# Altium footprint library NDLib.PCBLIB: 499 footprints (part 15 of 32)
Each footprint in its own frame and in the unit in brackets; x right, y up, seen from the top. Pads: shape width x height; smd on the part's side, far side on the other; paste and mask are expansions set on the pad; w line width, h text height; cw(c..) or ccw(c..) is an arc to the next point about the centre after c.
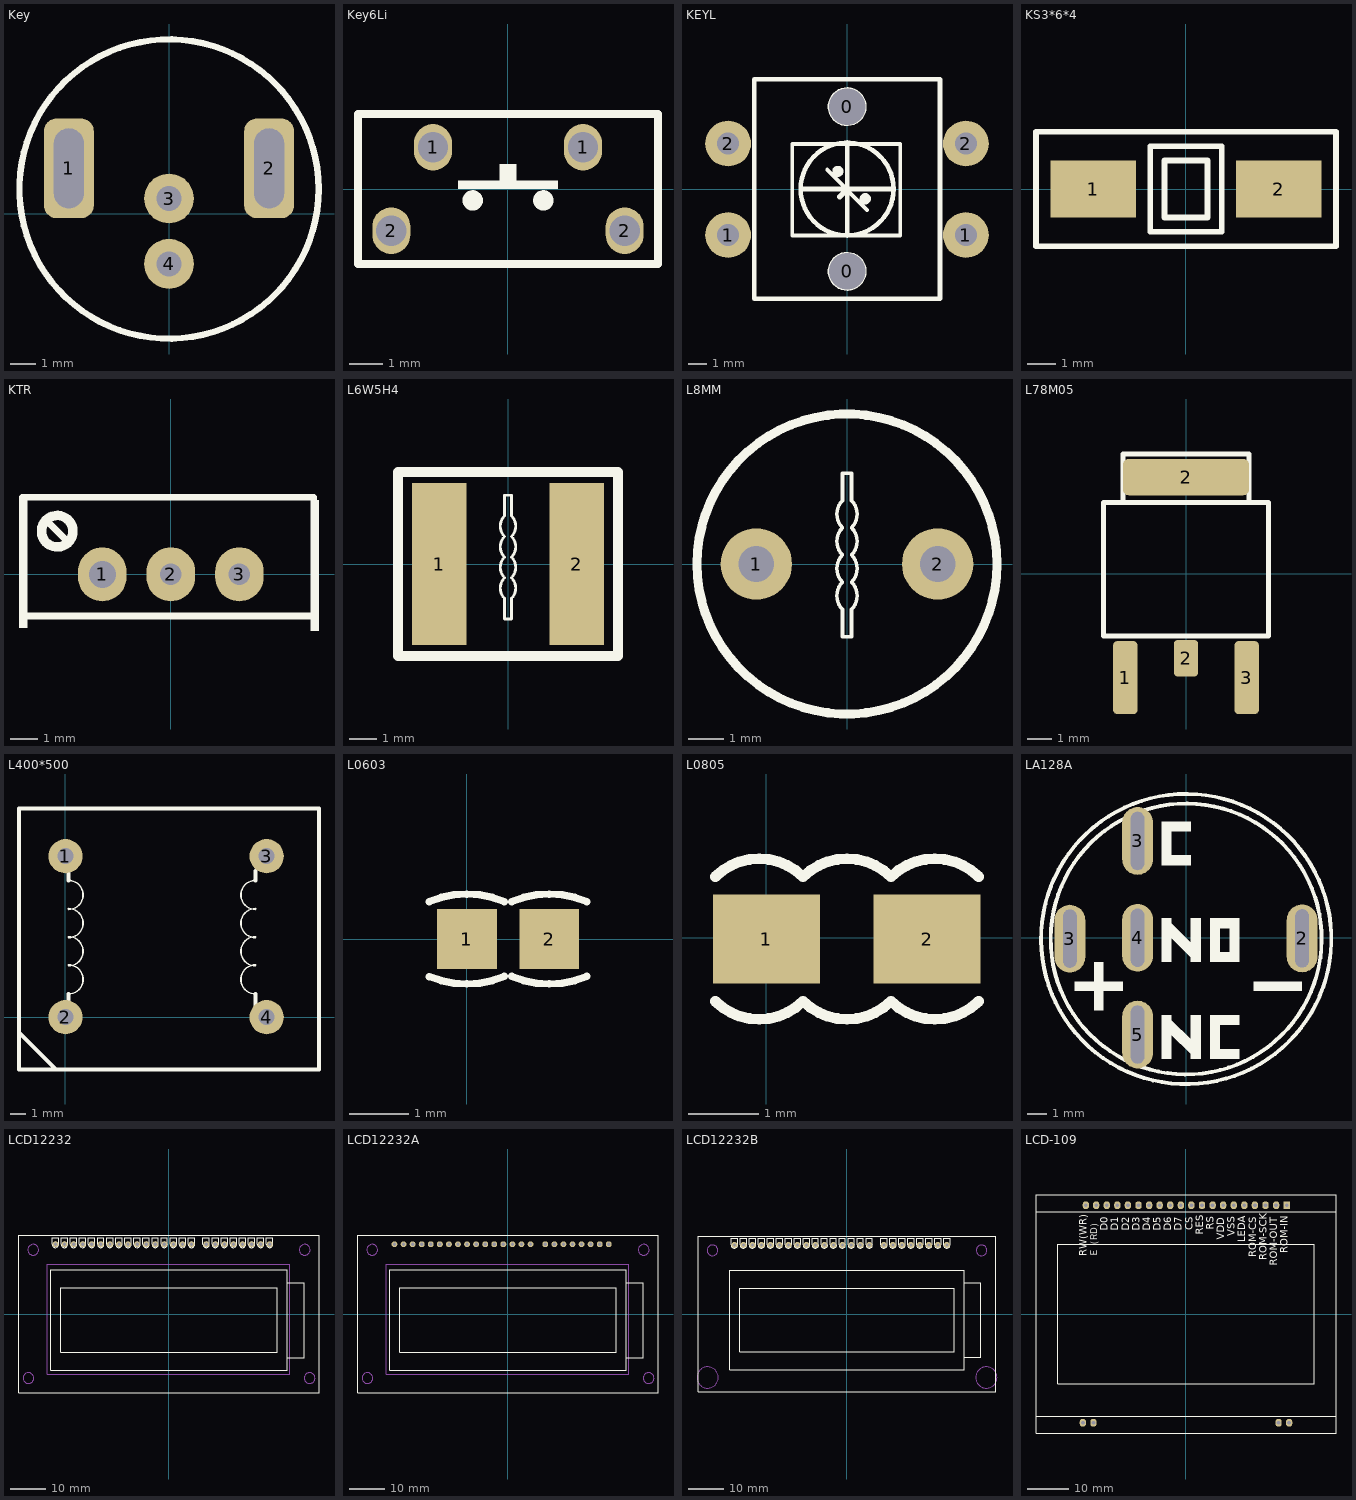
[diagram p14: the footprints below, top view; thin cyan lines are the x and y axes]

## Key [mm]
pads (4):
  rrect50% 2x4 hole 1.2 slot 3.2 at 90 deg: 1(-4.015,1.827) 2(4.015,1.827)
  round 2 hole 1: 3(0,0.619) 4(0,-2)
TopOverlay:
  circle w0.254: c0,1 r6

## Key6Li [mil]
height 295.28
pads (4):
  oval 45x55 hole 36: 1(-88.58,49.21) 1(88.58,49.21) 2(-137.8,-49.21) 2(137.8,-49.21)
TopOverlay:
  circle w12: c-41.72,-13.44 r6
  circle w12: c41.72,-13.44 r6
  rectangle: -59.06,0 59.06,9.84
  region: 9.84,9.84 9.84,29.53 0,29.53 0,9.84
  region: 0,9.84 0,29.53 -9.84,29.53 -9.84,9.84
  lines w10: -177.17,-88.58 -177.17,88.58 177.17,88.58 177.17,-88.58 -177.17,-88.58

## KEYL [mm]
pads (6):
  round 1.651 hole 2 unplated: 0(0,-4.5) 0(0,4.5)
  round 2.5 hole 1.2: 1(-6.506,-2.516) 1(6.494,-2.516) 2(-6.506,2.484) 2(6.494,2.484)
TopOverlay:
  circle w0.127: c0,4.5 r1
  circle w0.127: c0,-4.5 r1
  circle w0.305: c-0.508,0.965 r0.152
  circle w0.305: c0.991,-0.533 r0.152
  circle w0.254: c0,0 r2.54
  lines w0.2: -2.997,-2.54 -2.997,2.464 2.896,2.464 2.896,-2.54 -2.997,-2.54
  lines w0.203: -1.092,1.067 1.092,-1.143
  lines w0.254: -2.54,0 2.54,0 ; 0,-2.54 0,2.54 ; -5.08,-6 -5.08,6 5.08,6 5.08,-6 -5.08,-6
  lines w0.305: -0.406,-0.432 0,-0.025
BottomOverlay:
  circle w0.5: c-6.506,2.484 r1.7
  circle w0.5: c-6.506,-2.516 r1.7
  circle w0.5: c6.494,2.484 r1.7
  circle w0.5: c6.494,-2.516 r1.7

## KS3*6*4 [mm]
pads (2):
  rect 3x2 smd: 1(-3.25,0) 2(3.25,0)
TopOverlay:
  lines w0.2: -5.25,-2 -5.25,2 5.25,2 5.25,-2 -5.25,-2 ; -1.25,-1.5 1.25,-1.5 1.25,1.5 -1.25,1.5 -1.25,-1.5 ; -0.75,-1 0.75,-1 0.75,1 -0.75,1 -0.75,-1

## KTR [mm]
pads (3):
  oval 1.8x2 hole 1: 1(-2.54,0)
  oval 1.8x2 hole 0.8: 2(0,0) 3(2.54,0)
TopOverlay:
  circle w0.354: c-4.211,1.601 r0.583
  rectangle: -5.627,-1.992 -5.307,2.86
  rectangle: 5.173,-2.092 5.493,2.761
  lines w0.254: -5.5,-1.84 -5.5,2.86 5.3,2.86 5.3,-1.939 ; -5.4,-1.54 5.3,-1.54 ; -4.611,2.001 -3.811,1.201

## L6W5H4 [mm]
height 40
pads (2):
  rect 2x6 smd: 1(-2.54,0) 2(2.54,0)
TopOverlay:
  lines w0.1: -0.127,-1.27 cw(c0.254,-0.889) -0.127,-0.508 cw(c0.254,-0.127) -0.127,0.254 cw(c0.254,0.635) -0.127,1.016 cw(c0.254,1.397) -0.127,1.778 ; 0.127,-1.27 ccw(c-0.254,-0.889) 0.127,-0.508 ccw(c-0.254,-0.127) 0.127,0.254 ccw(c-0.254,0.635) 0.127,1.016 ccw(c-0.254,1.397) 0.127,1.778
  lines w0.102: -0.127,-1.27 -0.127,-2.032 0.127,-2.032 0.127,-1.27 ; -0.127,1.778 -0.127,2.54 0.127,2.54 0.127,1.778
  lines w0.381: -4.064,-3.4 4.064,-3.4 4.064,3.4 -4.064,3.4 -4.064,-3.4

## L8MM [mm]
height 10
pads (2):
  round 2 hole 1: 1(-2.54,0) 2(2.54,0)
TopOverlay:
  circle w0.254: c0,0 r4.2
  lines w0.1: -0.127,-1.27 cw(c0.254,-0.889) -0.127,-0.508 cw(c0.254,-0.127) -0.127,0.254 cw(c0.254,0.635) -0.127,1.016 cw(c0.254,1.397) -0.127,1.778 ; 0.127,-1.27 ccw(c-0.254,-0.889) 0.127,-0.508 ccw(c-0.254,-0.127) 0.127,0.254 ccw(c-0.254,0.635) 0.127,1.016 ccw(c-0.254,1.397) 0.127,1.778
  lines w0.102: -0.127,-1.27 -0.127,-2.032 0.127,-2.032 0.127,-1.27 ; -0.127,1.778 -0.127,2.54 0.127,2.54 0.127,1.778
3D body: height 7, standoff 0, extent 2.828,-2.863 4.013,2.812
3D body: height 7, standoff 0, extent -4.013,-4.039 2.838,3.987

## L78M05 [mm]
height 4
pads (4):
  rrect30% 1x3 smd: 1(-2.5,-4.282) 3(2.5,-4.282)
  rrect30% 1x1.5 smd: 2(0,-3.482)
  rrect30% 5.2x1.5 smd: 2(0,3.982)
TopOverlay:
  lines w0.2: -3.4,2.934 -3.4,-2.566 3.4,-2.566 3.4,2.934 ; -3.4,2.934 3.4,2.934 ; -3.4,2.934 -2.6,2.934 -2.6,4.934 2.6,4.934 2.6,2.934 3.4,2.934
3D body: height 0.77, standoff -0.01, extent -0.611,-8.606 0.639,-6.606

## L400*500 [mil]
pads (4):
  round 85 hole 40: 1(0,400) 2(0,0) 3(500,400) 4(500,0)
TopOverlay:
  lines w3.94: 7.44,57.3 ccw(c7.44,93.7) 7.44,130.1 ; 7.44,127.3 ccw(c7.44,163.7) 7.44,200.1 ; 7.44,197.3 ccw(c7.44,233.7) 7.44,270.1 ; 7.44,267.3 ccw(c7.44,303.7) 7.44,340.1 ; 472.44,57.3 cw(c472.44,93.7) 472.44,130.1 ; 472.44,127.3 cw(c472.44,163.7) 472.44,200.1 ; 472.44,197.3 cw(c472.44,233.7) 472.44,270.1 ; 472.44,267.3 cw(c472.44,303.7) 472.44,340.1
  lines w10: -115.37,-24.45 -115.37,-37.78 -23.48,-129.67 ; 7.44,23.7 7.44,57.3 ; 7.44,340.1 7.44,363.7 ; 472.44,28.7 472.44,57.3 ; 472.44,340.1 472.44,363.7 ; -115.37,-129.67 -115.37,518.11 629.97,518.11 629.97,-129.67 -115.37,-129.67

## L0603 [mil]
pads (2):
  rect 40x40 smd: 1(0,0) 2(55,0)
TopOverlay:
  lines w5: -25,-25 ccw(c0,35) 25,-25 ; -25,25 cw(c0,-35) 25,25 ; 30,-25 ccw(c55,35) 80,-25 ; 30,25 cw(c55,-35) 80,25

## L0805 [mil]
pads (2):
  rect 60x50 smd: 1(0.13,-0.61) 2(90.13,-0.61)
TopOverlay:
  lines w6: -28.54,-35.43 ccw(c-3.94,-10.83) 20.67,-35.43 ccw(c45.28,-10.83) 69.88,-35.43 ccw(c94.49,-10.83) 119.09,-35.43 ; -28.54,34.2 cw(c-3.94,9.6) 20.67,34.2 cw(c45.28,9.6) 69.88,34.2 cw(c94.49,9.6) 119.09,34.2

## LA128A [mm]
pads (5):
  oval 1.6x3.5 hole 0.7 slot 3 at 90 deg: 2(6,-0.035) 3(-6,-0.045) 3(-2.5,5) 4(-2.5,0) 5(-2.5,-5)
TopOverlay:
  region: 6,-2.75 6,-2.25 3.5,-2.25 3.5,-2.75
  region: -4.25,-1.25 -4.75,-1.25 -4.75,-3.75 -4.25,-3.75
  region: -3.25,-2.75 -3.25,-2.25 -5.75,-2.25 -5.75,-2.75
  region: 1.25,0.5 1.25,1 2.75,1 2.75,-1.25 1.25,-1.25 1.25,-0.75 2.25,-0.75 2.25,0.5
  region: -1.25,-4 -1.25,-6.25 -0.75,-6.25 -0.75,-5 0.25,-6 0.25,-6.25 0.75,-6.25 0.75,-4 0.25,-4 0.25,-5.25 -0.75,-4.25 -0.75,-4
  region: 0.25,5.5 0.25,6 -1.25,6 -1.25,3.75 0.25,3.75 0.25,4.25 -0.75,4.25 -0.75,5.5
  region: -1.25,1 -1.25,-1.25 -0.75,-1.25 -0.75,0 0.25,-1 0.25,-1.25 0.75,-1.25 0.75,1 0.25,1 0.25,-0.25 -0.75,0.75 -0.75,1
  region: 2.75,0.5 2.75,1 1.25,1 1.25,-1.25 2.75,-1.25 2.75,-0.75 1.75,-0.75 1.75,0.5
  region: 2.75,-4.5 2.75,-4 1.25,-4 1.25,-6.25 2.75,-6.25 2.75,-5.75 1.75,-5.75 1.75,-4.5
  lines w0.2: 0.049,6.935 ccw(c0.01,-0.065) 0.086,6.935 ; 0.051,7.435 ccw(c0.01,-0.065) 0.092,7.435

## LCD12232 [mil] "http://item.taobao.com/item.htm?spm=a1z10.3.w1959442389.13.aZLjon&id=15884040440&"
height 122
pads (24):
  round 65 hole 36: 1(-1251.44,768.34) 2(-1151.44,768.34) 3(-1051.44,768.34) 4(-951.44,768.34) 5(-851.44,768.34) 6(-751.44,768.34) 7(-651.44,768.34) 8(-551.44,768.34) 9(-451.44,768.34) 10(-351.44,768.34) 11(-251.44,768.34) 12(-151.44,768.34) 13(-51.44,768.34) 14(48.56,768.34) 15(148.56,768.34) 16(248.56,768.34) 17(411.09,768.34) 18(511.09,768.34) 19(611.09,768.34) 20(711.09,768.34) 21(811.09,768.34) 22(911.09,768.34) 23(1011.09,768.34) 24(1111.09,768.34)
TopOverlay:
  drawing of 198 lines, arcs and shapes, not listed
Mechanical1:
  circle w5: c1550.11,-706.17 r59.34
  circle w5: c-1550.11,-706.17 r59.34
  circle w5: c1496.41,707.81 r59.34
  circle w5: c-1496.41,707.81 r59.34
  circle w5: c1496.41,707.81 r59.34
  circle w5: c-1496.41,707.81 r59.34
  lines w6: -1342.67,-665.35 -1342.67,549.21 1332.33,549.21 1332.33,-665.35 -1342.67,-665.35

## LCD12232A [mil] "http://item.taobao.com/item.htm?spm=a1z10.3.w1959442389.13.aZLjon&id=15884040440&"
height 122
pads (24):
  round 65 hole 36: 1(-1251.44,768.34) 2(-1151.44,768.34) 3(-1051.44,768.34) 4(-951.44,768.34) 5(-851.44,768.34) 6(-751.44,768.34) 7(-651.44,768.34) 8(-551.44,768.34) 9(-451.44,768.34) 10(-351.44,768.34) 11(-251.44,768.34) 12(-151.44,768.34) 13(-51.44,768.34) 14(48.56,768.34) 15(148.56,768.34) 16(248.56,768.34) 17(411.09,768.34) 18(511.09,768.34) 19(611.09,768.34) 20(711.09,768.34) 21(811.09,768.34) 22(911.09,768.34) 23(1011.09,768.34) 24(1111.09,768.34)
TopOverlay:
  lines w5: -1653.53,-784.45 -1653.53,865.94 1653.53,865.94 1653.53,-782.48 ; -1653.53,-767.77 -1653.53,-865.94 1653.53,-865.94 1653.53,-767.77 ; -1304.99,-568.74 -1304.99,434.55 ; -1279.77,485.88 1304.99,485.88 1304.99,434.55 ; -1191.51,-382.31 -1191.51,248.12 ; -1151.89,286.85 1190.61,286.85 ; 1150.99,-421.04 -1191.51,-421.04 ; 1190.61,-382.31 1190.61,248.12 ; 1278.87,-620.07 -1279.77,-620.07 ; 1278.87,485.88 -1304.99,485.88 -1304.99,434.55 ; 1304.99,-568.74 1304.99,434.55 ; 1304.99,-480.48 1489.62,-480.48 1489.62,346.29 1304.99,346.29 ; 1447.29,344.49 1448.19,346.29 ; -1304.99,434.55 -1304.99,-620.07 -1279.77,-620.07 ; -1279.77,-620.07 1304.99,-620.07 1304.99,434.55 ; -1191.51,-421.04 1190.61,-421.04 1190.61,286.85 ; -1191.51,-421.04 -1191.51,286.85 1190.61,286.85
Mechanical1:
  circle w5: c1550.11,-706.17 r59.34
  circle w5: c-1550.11,-706.17 r59.34
  circle w5: c1496.41,707.81 r59.34
  circle w5: c-1496.41,707.81 r59.34
  circle w5: c1496.41,707.81 r59.34
  circle w5: c-1496.41,707.81 r59.34
  lines w6: -1342.67,-665.35 -1342.67,549.21 1332.33,549.21 1332.33,-665.35 -1342.67,-665.35

## LCD12232B [mil] "http://item.taobao.com/item.htm?spm=a1z10.3.w1959442389.13.aZLjon&id=15884040440&"
height 122
pads (24):
  round 65 hole 36: 1(-1251.44,768.34) 2(-1151.44,768.34) 3(-1051.44,768.34) 4(-951.44,768.34) 5(-851.44,768.34) 6(-751.44,768.34) 7(-651.44,768.34) 8(-551.44,768.34) 9(-451.44,768.34) 10(-351.44,768.34) 11(-251.44,768.34) 12(-151.44,768.34) 13(-51.44,768.34) 14(48.56,768.34) 15(148.56,768.34) 16(248.56,768.34) 17(411.09,768.34) 18(511.09,768.34) 19(611.09,768.34) 20(711.09,768.34) 21(811.09,768.34) 22(911.09,768.34) 23(1011.09,768.34) 24(1111.09,768.34)
TopOverlay:
  drawing of 198 lines, arcs and shapes, not listed
Mechanical1:
  circle w5: c1550.11,-706.17 r118.11
  circle w5: c-1550.11,-706.17 r118.11
  circle w5: c1496.41,707.81 r59.34
  circle w5: c-1496.41,707.81 r59.34
  circle w5: c1496.41,707.81 r59.34
  circle w5: c-1496.41,707.81 r59.34

## LCD-109 [mil]
height 196.85
pads (24):
  oval 60x75 hole 36: 0(-974.41,-1027.56) 0(-874.41,-1027.56) 0(874.41,-1027.56) 0(974.41,-1027.56) 2(851.18,1027.56) 3(751.18,1027.56) 4(651.18,1027.56) 5(551.18,1027.56) 6(451.18,1027.56) 7(351.18,1027.56) 8(251.18,1027.56) 9(151.18,1027.56) 10(51.18,1027.56) 11(-48.82,1027.56) 12(-148.82,1027.56) 13(-248.82,1027.56) 14(-348.82,1027.56) 15(-448.82,1027.56) 16(-548.82,1027.56) 17(-648.82,1027.56) 18(-748.82,1027.56) 19(-848.82,1027.56) 20(-946.46,1027.56)
  rect 60x75 hole 36: 1(951.18,1027.56)
TopOverlay:
  lines w8: -1417.31,-964.56 1417.33,-964.56 1417.33,964.58 -1417.31,964.58 ; -1417.31,-1125.98 1417.33,-1125.98 1417.33,1125.98 -1417.31,1125.98 -1417.31,-1125.98 ; -1210.62,-659.44 -1210.62,659.46 1210.64,659.46 1210.64,-659.44 -1210.62,-659.44
  text "ROM-IN" at 985.69,576.2 h118.11
  text "ROM-OUT" at 885.69,457.85 h118.11
  text "ROM-SCK" at 785.69,506.96 h118.11
  text "ROM-CS" at 685.69,537.31 h118.11
  text "LEDA" at 585.69,679.95 h118.11
  text "CS" at 85.69,790.1 h118.11
  text "RES" at 185.69,746.83 h118.11
  text "RS" at 285.69,795.95 h118.11
  text "VDD" at 385.69,701.19 h118.11
  text "VSS" at 485.69,734.24 h118.11
  text "D2" at -514.31,785.38 h118.11
  text "D1" at -614.31,785.38 h118.11
  text "D0" at -714.31,785.38 h118.11
  text "E（RD）" at -814.31,551.59 h118.11
  text "RW(WR)" at -914.31,547.54 h118.11
  text "D3" at -414.31,785.38 h118.11
  text "D4" at -314.31,785.38 h118.11
  text "D5" at -214.31,785.38 h118.11
  text "D6" at -114.31,785.38 h118.11
  text "D7" at -14.31,785.38 h118.11